# Altium footprint library DrPCB.PcbLib: 910 footprints (part 21 of 57)
Each footprint in its own frame and in the unit in brackets; x right, y up, seen from the top. Pads: shape width x height; smd on the part's side, far side on the other; paste and mask are expansions set on the pad; w line width, h text height; cw(c..) or ccw(c..) is an arc to the next point about the centre after c.
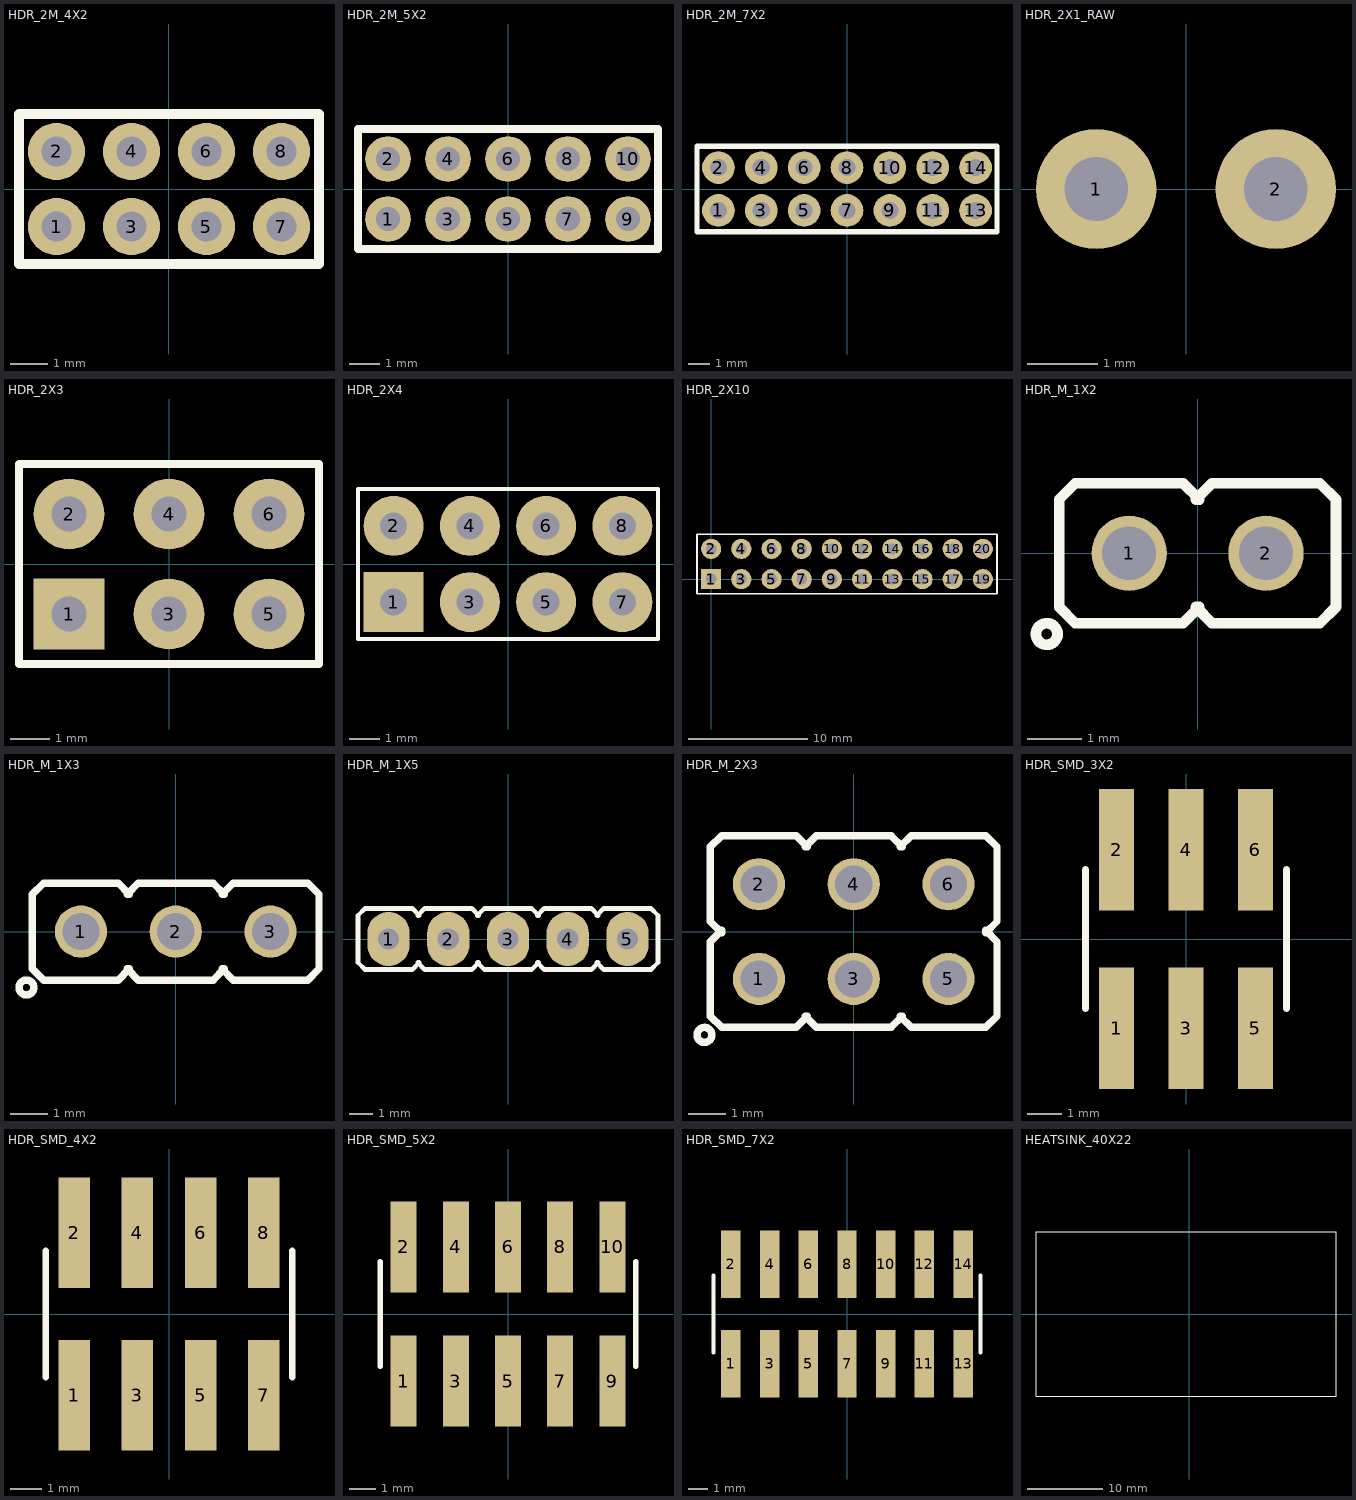
[diagram p20: the footprints below, top view; thin cyan lines are the x and y axes]

## HDR_2M_4X2 [mm]
pads (8):
  round 1.524 hole 0.8: 1(-3,-1) 2(-3,1) 3(-1,-1) 4(-1,1) 5(1,-1) 6(1,1) 7(3,-1) 8(3,1)
Top Overlay:
  lines w0.254: -4,1.981 -4,-2 3.972,-2 ; -4,2 4,2 ; 4,-2 4,1.981

## HDR_2M_5X2 [mm]
pads (10):
  round 1.524 hole 0.8: 1(-4,-1) 2(-4,1) 3(-2,-1) 4(-2,1) 5(0,-1) 6(0,1) 7(2,-1) 8(2,1) 9(4,-1) 10(4,1)
Top Overlay:
  lines w0.254: -5,1.981 -5,-2 5,-2 5,1.981 ; -5,2 5,2

## HDR_2M_7X2 [mm]
pads (14):
  round 1.524 hole 0.8: 1(-6,-1) 2(-6,1) 3(-4,-1) 4(-4,1) 5(-2,-1) 6(-2,1) 7(0,-1) 8(0,1) 9(2,-1) 10(2,1) 11(4,-1) 12(4,1) 13(6,-1) 14(6,1)
Top Overlay:
  lines w0.254: -7,1.981 -7,-2 6.966,-2 ; -7,2 6.992,2 ; 7,-2 7,1.981

## HDR_2X1_RAW [mm]
pads (2):
  round 1.7 hole 0.9: 1(-1.27,0) 2(1.27,0)

## HDR_2X3 [mm]
pads (6):
  rect 1.8x1.8 hole 0.9: 1(-2.54,-1.27)
  round 1.8 hole 0.9: 2(-2.54,1.27) 3(0,-1.27) 4(0,1.27) 5(2.54,-1.27) 6(2.54,1.27)
Top Overlay:
  lines w0.2: -1.058,-2.54 3.81,-2.54 ; 3.81,-2.54 3.81,2.54 -3.81,2.54 -3.81,-2.54 3.81,-2.54
3D body "female_header_a-bl254-dg-g06d.stp": height 8.51, standoff -3.19, extent -3.935,-2.5 3.935,2.5

## HDR_2X4 [mm]
pads (8):
  rect 2x2 hole 0.9: 1(-3.81,-1.27)
  round 2 hole 0.9: 2(-3.81,1.27) 3(-1.27,-1.27) 4(-1.27,1.27) 5(1.27,-1.27) 6(1.27,1.27) 7(3.81,-1.27) 8(3.81,1.27)
Top Overlay:
  lines w0.15: -5,-2.5 5,-2.5 5,2.5 -5,2.5 -5,-2.5
3D body "Pin Header 2x4 TH Pitch 2.54mm.stp": height 9.51, standoff -3.19, extent -5.08,-2.54 5.08,2.54

## HDR_2X10 [mm]
pads (20):
  rect 1.7x1.7 hole 0.9: 1(0,0)
  round 1.7 hole 0.9: 2(0,2.54) 3(2.54,0) 4(2.54,2.54) 5(5.08,0) 6(5.08,2.54) 7(7.62,0) 8(7.62,2.54) 9(10.16,0) 10(10.16,2.54) 11(12.7,0) 12(12.7,2.54) 13(15.24,0) 14(15.24,2.54) 15(17.78,0) 16(17.78,2.54) 17(20.32,0) 18(20.32,2.54) 19(22.86,0) 20(22.86,2.54)
Top Overlay:
  lines w0.15: 24.041,-1.23 -1.19,-1.23 -1.19,3.77 24.041,3.77 ; 24.05,-1.23 24.05,3.77
3D body "Pin Header 2x10 TH Pitch 2.54mm.stp": height 9.51, standoff -3.19, extent -1.274,-1.27 24.126,3.81

## HDR_M_1X2 [mm] "Connector; Header; 2 Position"
pads (2):
  round 1.4 / inner round 1.4 / far side oval 1.4x2.2 hole 1 mask+0.1: 1(-1.27,0) 2(1.27,0)
Top Overlay:
  circle w0.2: c-2.8,-1.5 r0.2
  lines w0.2: -0.03,-1 0.27,-1.3 2.27,-1.3 2.57,-1 2.57,1 2.27,1.3 0.27,1.3 -0.03,1 ; 0.03,-1 -0.27,-1.3 -2.27,-1.3 -2.57,-1 -2.57,1 -2.27,1.3 -0.27,1.3 0.03,1
3D body "pin_header_aw140-eg-g02a.stp": height 8.72, standoff -3.68, extent -2.54,-1.25 2.44,1.25

## HDR_M_1X3 [mm] "Connector; Header; 3 Position"
pads (3):
  round 1.4 / inner round 1.4 / far side oval 1.4x2.2 hole 1 mask+0.1: 1(-2.54,0) 2(0,0) 3(2.54,0)
Top Overlay:
  circle w0.2: c-4,-1.5 r0.2
  lines w0.2: -1.3,-1 -1,-1.3 1,-1.3 1.3,-1 ; -1.3,1 -1,1.3 1,1.3 1.3,1 ; -1.24,-1 -1.54,-1.3 -3.54,-1.3 -3.84,-1 -3.84,1 -3.54,1.3 -1.54,1.3 -1.24,1 ; 1.24,-1 1.54,-1.3 3.54,-1.3 3.84,-1 3.84,1 3.54,1.3 1.54,1.3 1.24,1
3D body "PLS-1.step": height 8.54, standoff -2.9, extent 1.295,-1.27 3.835,1.27
3D body "PLS-1.step": height 8.54, standoff -2.9, extent -3.785,-1.27 -1.245,1.27
3D body "PLS-1.step": height 8.54, standoff -2.9, extent -1.245,-1.27 1.295,1.27

## HDR_M_1X5 [mm] "Connector; Header; 5 Position"
pads (5):
  oval 1.8x2.3 hole 0.9 mask+0.1: 1(-5.08,0) 2(-2.54,0) 3(0,0) 4(2.54,0) 5(5.08,0)
Top Overlay:
  lines w0.2: -3.84,-1 -3.54,-1.3 -1.54,-1.3 -1.24,-1 ; -3.84,1 -3.54,1.3 -1.54,1.3 -1.24,1 ; -3.78,-1 -4.08,-1.3 -6.08,-1.3 -6.38,-1 -6.38,1 -6.08,1.3 -4.08,1.3 -3.78,1 ; -1.3,-1 -1,-1.3 1,-1.3 1.3,-1 ; -1.3,1 -1,1.3 1,1.3 1.3,1 ; 1.24,-1 1.54,-1.3 3.54,-1.3 3.84,-1 ; 1.24,1 1.54,1.3 3.54,1.3 3.84,1 ; 3.78,-1 4.08,-1.3 6.08,-1.3 6.38,-1 6.38,1 6.08,1.3 4.08,1.3 3.78,1
3D body "PLS-1.step": height 8.54, standoff -2.9, extent -3.81,-1.27 -1.27,1.27
3D body "PLS-1.step": height 8.54, standoff -2.9, extent -6.35,-1.27 -3.81,1.27
3D body "PLS-1.step": height 8.54, standoff -2.9, extent -1.27,-1.27 1.27,1.27
3D body "PLS-1.step": height 8.54, standoff -2.9, extent 1.27,-1.27 3.81,1.27
3D body "PLS-1.step": height 8.54, standoff -2.9, extent 3.81,-1.27 6.35,1.27

## HDR_M_2X3 [mm] "Connector; Header; 3x2 Position"
pads (6):
  round 1.4 / inner round 1.4 / far side oval 1.4x2.2 hole 1 mask+0.1: 1(-2.54,-1.27) 2(-2.54,1.27) 3(0,-1.27) 4(0,1.27) 5(2.54,-1.27) 6(2.54,1.27)
Top Overlay:
  circle w0.2: c-4,-2.77 r0.2
  lines w0.2: -3.54,-0.03 -3.84,0.27 -3.84,2.27 -3.54,2.57 -1.54,2.57 -1.24,2.27 ; -3.54,0.03 -3.84,-0.27 -3.84,-2.27 -3.54,-2.57 -1.54,-2.57 -1.24,-2.27 ; -1.3,-2.27 -1,-2.57 1,-2.57 1.3,-2.27 ; -1.3,2.27 -1,2.57 1,2.57 1.3,2.27 ; 1.24,-2.27 1.54,-2.57 3.54,-2.57 3.84,-2.27 3.84,-0.27 3.54,0.03 ; 1.24,2.27 1.54,2.57 3.54,2.57 3.84,2.27 3.84,0.27 3.54,-0.03
3D body "User Library-HEADER, 2X3, 2_54MM X 2_54MM PITCH, VERT, TH.step": height 8.38, standoff -3.81, extent -3.81,-2.6 3.81,2.48

## HDR_SMD_3X2 [mm]
pads (6):
  rect 1x3.5 smd: 1(-2,-2.572) 2(-2,2.572) 3(0,-2.572) 4(0,2.572) 5(2,-2.572) 6(2,2.572)
Top Overlay:
  lines w0.2: -2.9,-2 -2.9,2 ; 2.9,-2 2.9,2

## HDR_SMD_4X2 [mm]
pads (8):
  rect 1x3.5 smd: 1(-3,-2.572) 2(-3,2.572) 3(-1,-2.572) 4(-1,2.572) 5(1,-2.572) 6(1,2.572) 7(3,-2.572) 8(3,2.572)
Top Overlay:
  lines w0.2: -3.9,-2 -3.9,2 ; 3.906,-2 3.906,2

## HDR_SMD_5X2 [mm]
pads (10):
  rect 1x3.5 smd: 1(-4,-2.572) 2(-4,2.572) 3(-2,-2.572) 4(-2,2.572) 5(0,-2.572) 6(0,2.572) 7(2,-2.572) 8(2,2.572) 9(4,-2.572) 10(4,2.572)
Top Overlay:
  lines w0.2: -4.9,-2 -4.9,2 ; 4.9,-2 4.9,2

## HDR_SMD_7X2 [mm]
pads (14):
  rect 1x3.5 smd: 1(-6.001,-2.572) 2(-6.001,2.572) 3(-4,-2.572) 4(-4,2.572) 5(-2,-2.572) 6(-2,2.572) 7(0,-2.572) 8(0,2.572) 9(2,-2.572) 10(2,2.572) 11(4,-2.572) 12(4,2.572) 13(6.001,-2.572) 14(6.001,2.572)
Top Overlay:
  lines w0.2: -6.9,-2 -6.9,2 ; 6.9,-2 6.9,2

## HEATSINK_40X22 [mm]
Top Overlay:
  lines w0.15: -20.458,-10.975 19.542,-10.975 19.542,11.025 -20.458,11.025 -20.458,-10.975
3D body "Heatsink2.STEP": height 4.7, standoff 1.5, extent -20.458,-10.975 19.542,11.025